# Altium footprint library PCB贴片元件封装库.pcblib: 366 footprints (part 18 of 23)
Each footprint in its own frame and in the unit in brackets; x right, y up, seen from the top. Pads: shape width x height; smd on the part's side, far side on the other; paste and mask are expansions set on the pad; w line width, h text height; cw(c..) or ccw(c..) is an arc to the next point about the centre after c.
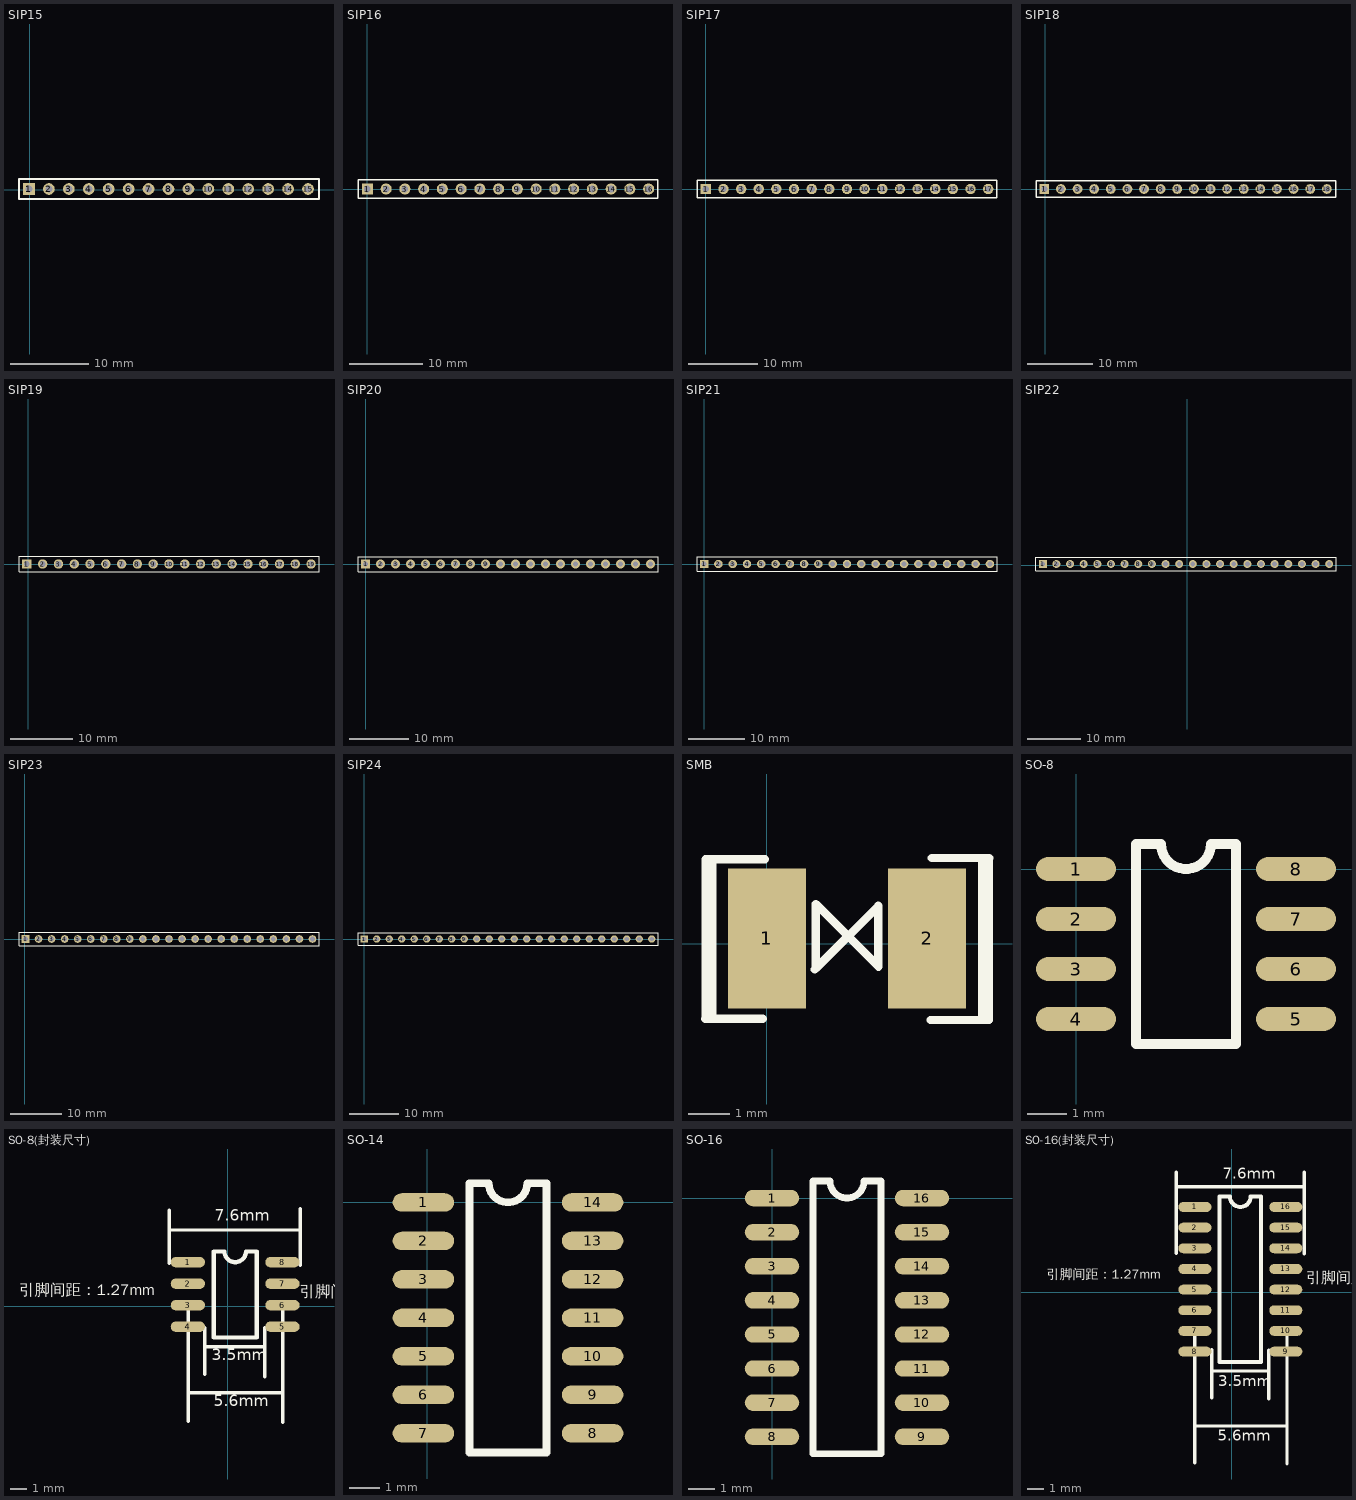
[diagram p17: the footprints below, top view; thin cyan lines are the x and y axes]

## SIP15 [mm]
pads (15):
  rect 1.5x1.5 hole 0.9: 1(-0.127,0.127)
  round 1.5 hole 0.9: 2(2.413,0.127) 3(4.953,0.127) 4(7.493,0.127) 5(10.033,0.127) 6(12.573,0.127) 7(15.113,0.127) 8(17.653,0.127) 9(20.193,0.127) 10(22.733,0.127) 11(25.273,0.127) 12(27.813,0.127) 13(30.353,0.127) 14(32.893,0.127) 15(35.433,0.127)
TopOverlay:
  lines w0.2: -1.397,-1.143 36.83,-1.143 36.83,1.397 0.508,1.397 -1.397,1.397 -1.397,-1.143

## SIP16 [mm]
pads (16):
  rect 1.5x1.5 hole 0.9: 1(0,0)
  round 1.5 hole 0.9: 2(2.54,0) 3(5.08,0) 4(7.62,0) 5(10.16,0) 6(12.7,0) 7(15.24,0) 8(17.78,0) 9(20.32,0) 10(22.86,0) 11(25.4,0) 12(27.94,0) 13(30.48,0) 14(33.02,0) 15(35.56,0) 16(38.1,0)
TopOverlay:
  lines w0.2: -1.27,-1.27 -1.27,1.27 0.635,1.27 39.37,1.27 39.37,-1.27 -1.27,-1.27

## SIP17 [mm]
pads (17):
  rect 1.5x1.5 hole 0.9: 1(0,0)
  round 1.5 hole 0.9: 2(2.54,0) 3(5.08,0) 4(7.62,0) 5(10.16,0) 6(12.7,0) 7(15.24,0) 8(17.78,0) 9(20.32,0) 10(22.86,0) 11(25.4,0) 12(27.94,0) 13(30.48,0) 14(33.02,0) 15(35.56,0) 16(38.1,0) 17(40.64,0)
TopOverlay:
  lines w0.2: -1.27,-1.27 41.91,-1.27 41.91,1.27 0.635,1.27 -1.27,1.27 -1.27,-1.27

## SIP18 [mm]
pads (18):
  rect 1.5x1.5 hole 0.9: 1(-0.127,0)
  round 1.5 hole 0.9: 2(2.413,0) 3(4.953,0) 4(7.493,0) 5(10.033,0) 6(12.573,0) 7(15.113,0) 8(17.653,0) 9(20.193,0) 10(22.733,0) 11(25.273,0) 12(27.813,0) 13(30.353,0) 14(32.893,0) 15(35.433,0) 16(37.973,0) 17(40.513,0) 18(43.053,0)
TopOverlay:
  lines w0.2: -1.397,-1.27 44.45,-1.27 44.45,1.27 0.508,1.27 -1.397,1.27 -1.397,-1.27

## SIP19 [mm]
pads (19):
  rect 1.5x1.5 hole 0.9: 1(-0.254,0)
  round 1.5 hole 0.9: 2(2.286,0) 3(4.826,0) 4(7.366,0) 5(9.906,0) 6(12.446,0) 7(14.986,0) 8(17.526,0) 9(20.066,0) 10(22.606,0) 11(25.146,0) 12(27.686,0) 13(30.226,0) 14(32.766,0) 15(35.306,0) 16(37.846,0) 17(40.386,0) 18(42.926,0) 19(45.466,0)
TopOverlay:
  lines w0.2: -1.524,-1.27 46.736,-1.27 46.736,1.27 0.381,1.27 -1.524,1.27 -1.524,-1.27

## SIP20 [mm]
pads (20):
  rect 1.5x1.5 hole 0.9: 1(0,0)
  round 1.5 hole 0.9: 2(2.54,0) 3(5.08,0) 4(7.62,0) 5(10.16,0) 6(12.7,0) 7(15.24,0) 8(17.78,0) 9(20.32,0) 10(22.86,0) 11(25.4,0) 12(27.94,0) 13(30.48,0) 14(33.02,0) 15(35.56,0) 16(38.1,0) 17(40.64,0) 18(43.18,0) 19(45.72,0) 20(48.26,0)
TopOverlay:
  lines w0.2: -1.27,-1.27 49.53,-1.27 49.53,1.27 0.635,1.27 -1.27,1.27 -1.27,-1.27

## SIP21 [mm]
pads (21):
  rect 1.5x1.5 hole 0.9: 1(0,0)
  round 1.5 hole 0.9: 2(2.54,0) 3(5.08,0) 4(7.62,0) 5(10.16,0) 6(12.7,0) 7(15.24,0) 8(17.78,0) 9(20.32,0) 10(22.86,0) 11(25.4,0) 12(27.94,0) 13(30.48,0) 14(33.02,0) 15(35.56,0) 16(38.1,0) 17(40.64,0) 18(43.18,0) 19(45.72,0) 20(48.26,0) 21(50.8,0)
TopOverlay:
  lines w0.2: -1.27,-1.27 52.07,-1.27 52.07,1.27 0.635,1.27 -1.27,1.27 -1.27,-1.27

## SIP22 [mm]
pads (22):
  rect 1.5x1.5 hole 0.9: 1(-26.924,0.254)
  round 1.5 hole 0.9: 2(-24.384,0.254) 3(-21.844,0.254) 4(-19.304,0.254) 5(-16.764,0.254) 6(-14.224,0.254) 7(-11.684,0.254) 8(-9.144,0.254) 9(-6.604,0.254) 10(-4.064,0.254) 11(-1.524,0.254) 12(1.016,0.254) 13(3.556,0.254) 14(6.096,0.254) 15(8.636,0.254) 16(11.176,0.254) 17(13.716,0.254) 18(16.256,0.254) 19(18.796,0.254) 20(21.336,0.254) 21(23.876,0.254) 22(26.416,0.254)
TopOverlay:
  lines w0.2: -28.194,-1.016 27.686,-1.016 27.686,1.524 -26.289,1.524 -28.194,1.524 -28.194,-1.016

## SIP23 [mm]
pads (23):
  rect 1.5x1.5 hole 0.9: 1(0.127,0)
  round 1.5 hole 0.9: 2(2.667,0) 3(5.207,0) 4(7.747,0) 5(10.287,0) 6(12.827,0) 7(15.367,0) 8(17.907,0) 9(20.447,0) 10(22.987,0) 11(25.527,0) 12(28.067,0) 13(30.607,0) 14(33.147,0) 15(35.687,0) 16(38.227,0) 17(40.767,0) 18(43.307,0) 19(45.847,0) 20(48.387,0) 21(50.927,0) 22(53.467,0) 23(56.007,0)
TopOverlay:
  lines w0.2: -1.143,-1.27 57.277,-1.27 57.277,1.27 0.762,1.27 -1.143,1.27 -1.143,-1.27

## SIP24 [mm]
pads (24):
  rect 1.5x1.5 hole 0.9: 1(0,0)
  round 1.5 hole 0.9: 2(2.54,0) 3(5.08,0) 4(7.62,0) 5(10.16,0) 6(12.7,0) 7(15.24,0) 8(17.78,0) 9(20.32,0) 10(22.86,0) 11(25.4,0) 12(27.94,0) 13(30.48,0) 14(33.02,0) 15(35.56,0) 16(38.1,0) 17(40.64,0) 18(43.18,0) 19(45.72,0) 20(48.26,0) 21(50.8,0) 22(53.34,0) 23(55.88,0) 24(58.42,0)
TopOverlay:
  lines w0.2: -1.27,-1.27 -1.27,1.27 0.635,1.27 59.69,1.27 59.69,-1.27 -1.27,-1.27

## SMB [mm]
pads (2):
  rect 1.9x3.4 smd: 1(0,0.127) 2(3.9,0.127)
TopOverlay:
  lines w0.2: -1.499,-1.829 -0.099,-1.829 ; -1.493,-1.803 -1.493,2.057 -0.048,2.057 ; -1.321,-1.753 -1.321,1.981 ; 3.985,-1.854 5.385,-1.854 ; 4.01,2.083 5.41,2.083 ; 5.232,-1.803 5.232,2.057 ; 5.405,-1.854 5.405,2.083
  lines w0.203: 1.162,-0.629 2.712,0.92 ; 2.712,-0.553 2.712,0.92 ; 2.718,-0.559 1.194,0.965 1.194,-0.597 2.712,0.92

## SO-8 [mil]
pads (8):
  oval 80x24 smd: 1(0,0) 2(0,-50) 3(0,-100) 4(0,-150) 5(220,-150) 6(220,-100) 7(220,-50) 8(220,0)
TopOverlay:
  lines w10: 60,-175 160,-175 160,25 135,25 cw(c110,25) 85,25 60,25 60,-175

## SO-8(封装尺寸) [mil]
pads (8):
  oval 80x24 smd: 1(-93,103) 2(-93,53) 3(-93,3) 4(-93,-47) 5(127,-47) 6(127,3) 7(127,53) 8(127,103)
TopOverlay:
  lines w8: -136,100 -136,224 ; -136,178 167,178 168,179 ; -92,-267 -92,2 ; -92,-201 128,-201 ; -54,-158 -54,-50 ; -54,-94 84,-94 ; 86,-164 86,-49 ; 128,-270 128,4 ; 168,96 168,227
  lines w10: -33,-72 67,-72 67,128 42,128 cw(c17,128) -8,128 -33,128 -33,-72
  text "7.6mm" at -31,190 h45
  text "3.5mm" at -38,-134 h45
  text "5.6mm" at -33,-242 h45
  text "引脚间距：1.27mm" at -486,17 h45
  text "引脚间距：1.27mm" at 167,13 h45

## SO-14 [mil]
pads (14):
  oval 80x24 smd: 1(-5,0) 2(-5,-50) 3(-5,-100) 4(-5,-150) 5(-5,-200) 6(-5,-250) 7(-5,-300) 8(215,-300) 9(215,-250) 10(215,-200) 11(215,-150) 12(215,-100) 13(215,-50) 14(215,0)
TopOverlay:
  lines w10: 55,-325 55,25 80,25 ccw(c105,25) 130,25 155,25 155,-325 55,-325

## SO-16 [mil]
pads (16):
  oval 80x24 smd: 1(0,0) 2(0,-50) 3(0,-100) 4(0,-150) 5(0,-200) 6(0,-250) 7(0,-300) 8(0,-350) 9(220,-350) 10(220,-300) 11(220,-250) 12(220,-200) 13(220,-150) 14(220,-100) 15(220,-50) 16(220,0)
TopOverlay:
  lines w10: 60,-375 160,-375 160,25 135,25 cw(c110,25) 85,25 60,25 60,-375

## SO-16(封装尺寸) [mil]
pads (16):
  oval 80x24 smd: 1(-89,206) 2(-89,156) 3(-89,106) 4(-89,56) 5(-89,6) 6(-89,-44) 7(-89,-94) 8(-89,-144) 9(131,-144) 10(131,-94) 11(131,-44) 12(131,6) 13(131,56) 14(131,106) 15(131,156) 16(131,206)
TopOverlay:
  lines w8: -134,94 -134,290 ; -134,255 176,255 ; -89,-413 -89,-93 ; -89,-323.99 134,-323.99 ; -48,-256 -48,-139 ; -48,-191 89,-191 ; 90,-258 90,-141 ; 134,-416 134,-90 ; 176,93 176,290
  lines w10: -29,-169 -29,231 -4,231 ccw(c21,231) 46,231 71,231 71,-169 -29,-169
  text "3.5mm" at -33,-237 h45
  text "引脚间距：1.27mm" at -447,24 h40
  text "引脚间距：1.27mm" at 181,13 h45
  text "7.6mm" at -21,265 h45
  text "5.6mm" at -34,-369 h45